# Altium footprint library ICs And Semiconductors THD.PcbLib: 507 footprints (part 20 of 32) (continued)
## LED_MENTOR_RTZ.2081G [mm] "8x Diametre 2mm Green LED Horizontal LED Array" (continued)
  text "3" at -4.227,3.375 h1
  text "4" at -4.227,0.835 h1
  text "5" at -4.227,-1.705 h1
  text "6" at -4.227,-4.245 h1
  text "7" at -4.227,-6.785 h1
  text "8" at -4.227,-9.325 h1
3D body "LED_MENTOR_RTZ.2081G.stp": height 5.08, standoff -3.3, extent -7.37,-10.16 1.93,10.16

## LED_VISHAY_TSAL6200 [mm] "5mm Infrared Emitting Diode, VISHAY TSAL"
height 13.7
pads (2):
  rect 1.3x1.3 hole 0.8: 1(-1.27,0)
  round 1.3 hole 0.8: 2(1.27,0)
Top Overlay:
  lines w0.2: -0.3,-0.6 -0.3,0.6 ; -2.5,-1.47 ccw(c0,0) -2.5,1.47 -2.5,-1.47 ; -0.3,0 0.3,0.6 0.3,-0.6 -0.3,0
Notvisible:
  lines w0.1: -1.27,1 -1.27,0 -0.27,0 ; 0,1 0,0 1,0 ; 1.27,1 1.27,0 2.27,0 ; -1.52,-0.25 -1.02,-0.25 -1.02,0.25 -1.52,0.25 -1.52,-0.25 ; 1.02,-0.25 1.52,-0.25 1.52,0.25 1.02,0.25 1.02,-0.25
  text "A" at 0.913,1 h1
  text "C" at -1.651,1 h1
Mechanical 14:
  circle w0.1: c0,0 r2.5
  lines w0.1: -0.3,-0.6 -0.3,0.6 ; -2.5,-1.47 ccw(c0,0) -2.5,1.47 -2.5,-1.47 ; -0.3,0 0.3,-0.6 0.3,0.6 -0.3,0
3D body "LED_VISHAY_TSAL6200.stp": height 13.7, standoff -3.1, extent -2.5,-2.9 2.9,2.9

## LEDLP_DIALIGHT_515-1049F [mm] "Right Angle Single Element 3.56mm Round Lightpipe"
height 5.3
pads (2):
  round 1 hole 1.95 unplated mask+0.475: 1(-6.86,0) 2(-3.89,0)
Top Overlay:
  lines w0.2: -8.13,-1.778 -8.13,-0.527 ; -8.13,0.527 -8.13,1.778 ; 1.268,-1.778 -15.413,-1.778 cw(c2.68,0) -15.413,1.778 1.268,1.778
Notvisible:
  lines w0.1: -7.36,0 -6.86,0 ; -6.86,-0.5 -6.86,0 ; -6.86,0.5 -6.86,0 ; -6.36,0 -6.86,0 ; -4.39,0 -3.89,0 ; -3.89,-0.5 -3.89,0 ; -3.89,0.5 -3.89,0 ; -3.39,0 -3.89,0 ; -0.5,0 0,0 ; 0,-0.5 0,0 ; 0,0.5 0,0 ; 0.5,0 0,0
3D body "LEDLP_DIALIGHT_515-1049F.stp": height 5.27, standoff -2.41, extent -15.5,-1.778 1.268,1.778

## LEDLP_DIALIGHT_515-1064F [mm] "Right Angle Tri-Level 2.5mm Round Light Pipe, Body 22.9 x5.22mm"
height 13.7
pads (2):
  round 1 hole 1.7 unplated mask+0.35: 1(-6.704,-2.29) 2(6.706,-2.29)
Top Overlay:
  lines w0.2: -12.167,-1.249 -12.167,2.257 -11.151,2.257 -11.151,1.241 ; -9.627,-2.544 -7.928,-2.544 ; -7.781,-2.925 -9.627,-2.925 -9.627,-1.249 ; -7.396,-1.249 -9.627,-1.249 ; -6.013,-1.249 6.014,-1.249 ; -5.628,-2.925 5.629,-2.925 ; -5.48,-2.544 5.482,-2.544 ; 7.397,-1.249 8.23,-1.249 ; 7.782,-2.925 8.23,-2.925 8.23,-1.1 ; 7.93,-2.544 8.23,-2.544 ; 8.23,1.1 8.23,1.241 -14.707,1.241 -14.707,-1.249 -9.627,-1.249
Notvisible:
  circle w0.1: c-6.704,-2.29 r0.85
  circle w0.1: c6.706,-2.29 r0.85
  lines w0.1: -7.204,-2.29 -6.704,-2.29 ; -7.204,0 -6.704,0 ; -6.704,-2.79 -6.704,-2.29 ; -6.704,-1.79 -6.704,-2.29 ; -6.704,-0.5 -6.704,0 ; -6.704,0.5 -6.704,0 ; -6.204,-2.29 -6.704,-2.29 ; -6.204,0 -6.704,0 ; -0.354,-0.354 0,0 ; -0.354,0.354 0,0 ; 0.354,-0.354 0,0 ; 0.354,0.354 0,0 ; 1.256,0 1.756,0 ; 1.756,-0.5 1.756,0 ; 1.756,0.5 1.756,0 ; 2.256,0 1.756,0 ; 6.206,-2.29 6.706,-2.29 ; 6.206,0 6.706,0 ; 6.706,-2.79 6.706,-2.29 ; 6.706,-1.79 6.706,-2.29 ; 6.706,-0.5 6.706,0 ; 6.706,0.5 6.706,0 ; 7.206,-2.29 6.706,-2.29 ; 7.206,0 6.706,0
Mechanical 14:
  lines w0.1: -12.167,-1.249 -12.167,2.257 -11.151,2.257 -11.151,1.241 ; -9.627,-2.544 8.23,-2.544 ; 3.078,-1.249 3.078,1.241 ; 8.23,-1.249 -9.627,-1.249 ; -9.627,-1.249 -9.627,-2.925 8.23,-2.925 8.23,1.241 -14.707,1.241 -14.707,-1.249 -9.627,-1.249
3D body "LEDLP_DIALIGHT_515-1064F.stp": height 13.69, standoff -2.87, extent -14.706,-2.925 8.23,2.257

## LEDLP_DIALIGHT_515-1118F [mm] "2 Array 1.9mm Round Horizontal Light Pipe, Body 55.8 x11.68mm"
height 14
pads (2):
  round 1 hole 2 unplated mask+0.5: 1(0,0) 2(0,5.791)
Top Overlay:
  lines w0.2: -38.735,-1.943 -53.975,-1.943 -53.975,-3.848 -38.735,-3.848 ; -38.735,1.943 -53.975,1.943 -53.975,3.848 -38.735,3.848 ; -1.1,6.883 -1.905,6.883 -1.905,4.801 -8.255,4.801 -38.735,3.848 ; 1.1,6.883 1.905,6.883 1.905,4.642 ; 1.905,-4.642 1.905,-4.801 -8.255,-4.801 -38.735,-3.848 ; 1.905,-1.149 1.905,1.149 ; -38.735,-3.848 -38.735,3.848
Notvisible:
  lines w0.1: -0.5,-2.896 0,-2.896 ; -0.5,0 0,0 ; -0.5,2.896 0,2.896 ; -0.5,5.791 0,5.791 ; 0,-3.396 0,-2.896 ; 0,-2.396 0,-2.896 ; 0,-0.5 0,0 ; 0,0.5 0,0 ; 0,2.396 0,2.896 ; 0,3.396 0,2.896 ; 0,5.291 0,5.791 ; 0,6.291 0,5.791 ; 0.5,-2.896 0,-2.896 ; 0.5,0 0,0 ; 0.5,2.896 0,2.896 ; 0.5,5.791 0,5.791
Mechanical 14:
  lines w0.1: -38.735,-1.943 -53.975,-1.943 -53.975,-3.848 -38.735,-3.848 ; -38.735,1.943 -53.975,1.943 -53.975,3.848 -38.735,3.848 ; -38.735,-3.848 -8.255,-4.801 1.905,-4.801 1.905,6.883 -1.905,6.883 -1.905,4.801 -8.255,4.801 -38.735,3.848 ; -38.735,-3.848 -38.735,3.848
3D body "LEDLP_DIALIGHT_515-1118F.stp": height 13.98, standoff -3.17, extent -53.975,-4.8 1.905,6.884

## LEDLP_MENTOR_1270.1010 [mm] "Right Angle Double Line 3mm Light Guide, 10x2-fold display, Body 49.12 x 23.6mm"
height 9.12
pads (20):
  round 1 hole 2.4 unplated mask+0.7: P1(-6.75,-22.86) P2(6.75,-22.86) P3(-6.75,-17.78) P4(6.75,-17.78) P5(-6.75,-12.7) P6(6.75,-12.7) P7(-6.75,-7.62) P8(6.75,-7.62) P9(-6.75,-2.54) P10(6.75,-2.54) P11(-6.75,2.54) P12(6.75,2.54) P13(-6.75,7.62) P14(6.75,7.62) P15(-6.75,12.7) P16(6.75,12.7) P17(-6.75,17.78) P18(6.75,17.78) P19(-6.75,22.86) P20(6.75,22.86)
Top Overlay:
  lines w0.2: -10.85,-24.36 -10.85,-21.36 ; -10.85,-19.28 -10.85,-16.28 ; -10.85,-14.2 -10.85,-11.2 ; -10.85,-9.12 -10.85,-6.12 ; -10.85,-4.04 -10.85,-1.04 ; -10.85,1.04 -10.85,4.04 ; -10.85,6.12 -10.85,9.12 ; -10.85,11.2 -10.85,14.2 ; -10.85,16.28 -10.85,19.28 ; -10.85,21.36 -10.85,24.36 ; -10.229,-24.36 cw(c-8.729,-22.86) -10.229,-21.36 ; -10.229,-19.28 cw(c-8.729,-17.78) -10.229,-16.28 ; -10.229,-14.2 cw(c-8.729,-12.7) -10.229,-11.2 ; -10.229,-9.12 cw(c-8.729,-7.62) -10.229,-6.12 ; -10.229,-4.04 cw(c-8.729,-2.54) -10.229,-1.04 ; -10.229,1.04 cw(c-8.729,2.54) -10.229,4.04 ; -10.229,6.12 cw(c-8.729,7.62) -10.229,9.12 ; -10.229,11.2 cw(c-8.729,12.7) -10.229,14.2 ; -10.229,16.28 cw(c-8.729,17.78) -10.229,19.28 ; -10.229,21.36 cw(c-8.729,22.86) -10.229,24.36 ; -8.85,-21.36 -8.85,-19.28 ; -8.85,-16.28 -8.85,-14.2 ; -8.85,-11.2 -8.85,-9.12 ; -8.85,-6.12 -8.85,-4.04 ; -8.85,-1.04 -8.85,1.04 ; -8.85,4.04 -8.85,6.12 ; -8.85,9.12 -8.85,11.2 ; -8.85,14.2 -8.85,16.28 ; -8.85,19.28 -8.85,21.36 ; -7.55,-24.36 -14.65,-24.36 -14.65,-24.06 -14.85,-23.86 -14.85,-21.86 -14.65,-21.66 -14.65,-21.36 -7.55,-21.36 ; -7.55,-19.28 -14.65,-19.28 -14.65,-18.98 -14.85,-18.78 -14.85,-16.78 -14.65,-16.58 -14.65,-16.28 -7.55,-16.28 ; -7.55,-14.2 -14.65,-14.2 -14.65,-13.9 -14.85,-13.7 -14.85,-11.7 -14.65,-11.5 -14.65,-11.2 -7.55,-11.2 ; -7.55,-9.12 -14.65,-9.12 -14.65,-8.82 -14.85,-8.62 -14.85,-6.62 -14.65,-6.42 -14.65,-6.12 -7.55,-6.12 ; -7.55,-4.04 -14.65,-4.04 -14.65,-3.74 -14.85,-3.54 -14.85,-1.54 -14.65,-1.34 -14.65,-1.04 -7.55,-1.04 ; -7.55,1.04 -14.65,1.04 -14.65,1.34 -14.85,1.54 -14.85,3.54 -14.65,3.74 -14.65,4.04 -7.55,4.04 ; -7.55,6.12 -14.65,6.12 -14.65,6.42 -14.85,6.62 -14.85,8.62 -14.65,8.82 -14.65,9.12 -7.55,9.12 ; -7.55,11.2 -14.65,11.2 -14.65,11.5 -14.85,11.7 -14.85,13.7 -14.65,13.9 -14.65,14.2 -7.55,14.2 ; -7.55,16.28 -14.65,16.28 -14.65,16.58 -14.85,16.78 -14.85,18.78 -14.65,18.98 -14.65,19.28 -7.55,19.28 ; -7.55,21.36 -14.65,21.36 -14.65,21.66 -14.85,21.86 -14.85,23.86 -14.65,24.06 -14.65,24.36 -7.55,24.36 ; 7.55,-24.36 8.75,-24.36 8.75,-21.36 7.55,-21.36 ; 7.55,-19.28 8.75,-19.28 8.75,-16.28 7.55,-16.28 ; 7.55,-14.2 8.75,-14.2 8.75,-11.2 7.55,-11.2 ; 7.55,-9.12 8.75,-9.12 8.75,-6.12 7.55,-6.12 ; 7.55,-4.04 8.75,-4.04 8.75,-1.04 7.55,-1.04 ; 7.55,1.04 8.75,1.04 8.75,4.04 7.55,4.04 ; 7.55,6.12 8.75,6.12 8.75,9.12 7.55,9.12 ; 7.55,11.2 8.75,11.2 8.75,14.2 7.55,14.2 ; 7.55,16.28 8.75,16.28 8.75,19.28 7.55,19.28 ; 7.55,21.36 8.75,21.36 8.75,24.36 7.55,24.36
Notvisible:
  drawing of 344 lines, arcs and shapes, not listed
Mechanical 14:
  lines w0.1: -10.85,-24.36 -10.85,-21.36 ; -10.85,-19.28 -10.85,-16.28 ; -10.85,-14.2 -10.85,-11.2 ; -10.85,-9.12 -10.85,-6.12 ; -10.85,-4.04 -10.85,-1.04 ; -10.85,1.04 -10.85,4.04 ; -10.85,6.12 -10.85,9.12 ; -10.85,11.2 -10.85,14.2 ; -10.85,16.28 -10.85,19.28 ; -10.85,21.36 -10.85,24.36 ; -10.229,-24.36 cw(c-8.729,-22.86) -10.229,-21.36 ; -10.229,-19.28 cw(c-8.729,-17.78) -10.229,-16.28 ; -10.229,-14.2 cw(c-8.729,-12.7) -10.229,-11.2 ; -10.229,-9.12 cw(c-8.729,-7.62) -10.229,-6.12 ; -10.229,-4.04 cw(c-8.729,-2.54) -10.229,-1.04 ; -10.229,1.04 cw(c-8.729,2.54) -10.229,4.04 ; -10.229,6.12 cw(c-8.729,7.62) -10.229,9.12 ; -10.229,11.2 cw(c-8.729,12.7) -10.229,14.2 ; -10.229,16.28 cw(c-8.729,17.78) -10.229,19.28 ; -10.229,21.36 cw(c-8.729,22.86) -10.229,24.36 ; -8.85,-21.36 -8.85,-19.28 ; -8.85,-16.28 -8.85,-14.2 ; -8.85,-11.2 -8.85,-9.12 ; -8.85,-6.12 -8.85,-4.04 ; -8.85,-1.04 -8.85,1.04 ; -8.85,4.04 -8.85,6.12 ; -8.85,9.12 -8.85,11.2 ; -8.85,14.2 -8.85,16.28 ; -8.85,19.28 -8.85,21.36 ; 0.65,-24.36 0.65,-21.36 ; 0.65,-19.28 0.65,-16.28 ; 0.65,-14.2 0.65,-11.2 ; 0.65,-9.12 0.65,-6.12 ; 0.65,-4.04 0.65,-1.04 ; 0.65,1.04 0.65,4.04 ; 0.65,6.12 0.65,9.12 ; 0.65,11.2 0.65,14.2 ; 0.65,16.28 0.65,19.28 ; 0.65,21.36 0.65,24.36 ; 0.95,-21.36 0.95,-19.28 ; 0.95,-16.28 0.95,-14.2 ; 0.95,-11.2 0.95,-9.12 ; 0.95,-6.12 0.95,-4.04 ; 0.95,-1.04 0.95,1.04 ; 0.95,4.04 0.95,6.12 ; 0.95,9.12 0.95,11.2 ; 0.95,14.2 0.95,16.28 ; 0.95,19.28 0.95,21.36 ; -14.85,-23.86 -14.85,-21.86 -14.65,-21.66 -14.65,-21.36 8.75,-21.36 8.75,-24.36 -14.65,-24.36 -14.65,-24.06 -14.85,-23.86 ; -14.85,-18.78 -14.85,-16.78 -14.65,-16.58 -14.65,-16.28 8.75,-16.28 8.75,-19.28 -14.65,-19.28 -14.65,-18.98 -14.85,-18.78 ; -14.85,-13.7 -14.85,-11.7 -14.65,-11.5 -14.65,-11.2 8.75,-11.2 8.75,-14.2 -14.65,-14.2 -14.65,-13.9 -14.85,-13.7 ; -14.85,-8.62 -14.85,-6.62 -14.65,-6.42 -14.65,-6.12 8.75,-6.12 8.75,-9.12 -14.65,-9.12 -14.65,-8.82 -14.85,-8.62 ; -14.85,-3.54 -14.85,-1.54 -14.65,-1.34 -14.65,-1.04 8.75,-1.04 8.75,-4.04 -14.65,-4.04 -14.65,-3.74 -14.85,-3.54 ; -14.85,1.54 -14.85,3.54 -14.65,3.74 -14.65,4.04 8.75,4.04 8.75,1.04 -14.65,1.04 -14.65,1.34 -14.85,1.54 ; -14.85,6.62 -14.85,8.62 -14.65,8.82 -14.65,9.12 8.75,9.12 8.75,6.12 -14.65,6.12 -14.65,6.42 -14.85,6.62 ; -14.85,11.7 -14.85,13.7 -14.65,13.9 -14.65,14.2 8.75,14.2 8.75,11.2 -14.65,11.2 -14.65,11.5 -14.85,11.7 ; -14.85,16.78 -14.85,18.78 -14.65,18.98 -14.65,19.28 8.75,19.28 8.75,16.28 -14.65,16.28 -14.65,16.58 -14.85,16.78 ; -14.85,21.86 -14.85,23.86 -14.65,24.06 -14.65,24.36 8.75,24.36 8.75,21.36 -14.65,21.36 -14.65,21.66 -14.85,21.86
3D body "LEDLP_MENTOR_1270.1010_Part1.stp": height 9.12, standoff 0.6, extent -8.85,-24.36 0.95,24.36
3D body "LEDLP_MENTOR_1270.1010_Part2.stp": height 9.12, standoff -3.1, extent -14.85,-24.36 8.75,24.36

## LEDLP_MENTOR_1276.1003 [mm] "Right Angle Tri-Level 3mm Round Light Pipe, Body 25.2 x 11.3mm"
height 18.2
pads (2):
  round 1 hole 2.4 unplated mask+0.7: 1(0,4.15) 2(0,-4.15)
Top Overlay:
  lines w0.2: -12.6,-1.5 -12.6,1.5 ; -12.6,-0.794 -11.7,-1.5 ; -12.6,0.794 -11.7,1.5 ; -8.3,-1.6 -3.5,-1.6 ; -8.3,1.6 -3.5,1.6 ; -3.5,-2.3 -8.3,-2.3 -8.3,2.3 -3.5,2.3 ; -3.5,-1.5 -15.6,-1.5 ; -3.5,1.5 -15.6,1.5 ; -3.3,-2.55 -3.3,-5.65 3.3,-5.65 3.3,-2.3 ; -3.3,2.55 -3.3,5.65 3.3,5.65 3.3,2.3 ; 3.3,-1.5 3.3,-2.3 ; 3.3,1.5 3.3,2.3 ; 3.3,1.6 4.1,1.6 ; 3.317,-1.6 4.1,-1.6 ; 4.1,-2.3 3.3,-2.3 ; 4.1,2.3 3.3,2.3 ; 7.1,-2.3 8.1,-2.3 8.1,2.3 7.1,2.3 ; 7.1,-1.6 7.4,-1.6 7.4,1.6 7.1,1.6 ; -15.6,-1.5 cw(c-15.6,0) -15.6,1.5 ; -15.6,-1.5 -15.6,1.5
Notvisible:
  circle w0.1: c0,-4.15 r1.2
  circle w0.1: c0,4.15 r1.2
  lines w0.1: -2.5,-1.425 -2,-1.425 ; -2.5,0 -2,0 ; -2.5,1.425 -2,1.425 ; -2,-1.925 -2,-1.425 ; -2,-0.925 -2,-1.425 ; -2,-0.5 -2,0 ; -2,0.5 -2,0 ; -2,0.925 -2,1.425 ; -2,1.925 -2,1.425 ; -1.5,-1.425 -2,-1.425 ; -1.5,0 -2,0 ; -1.5,1.425 -2,1.425 ; -0.5,-4.15 0,-4.15 ; -0.5,0 0,0 ; -0.5,4.15 0,4.15 ; 0,-4.65 0,-4.15 ; 0,-3.65 0,-4.15 ; 0,-0.5 0,0 ; 0,0.5 0,0 ; 0,3.65 0,4.15 ; 0,4.65 0,4.15 ; 0.5,-4.15 0,-4.15 ; 0.5,0 0,0 ; 0.5,4.15 0,4.15 ; 1.3,-1.425 1.8,-1.425 ; 1.3,0 1.8,0 ; 1.3,1.425 1.8,1.425 ; 1.8,-1.925 1.8,-1.425 ; 1.8,-0.925 1.8,-1.425 ; 1.8,-0.5 1.8,0 ; 1.8,0.5 1.8,0 ; 1.8,0.925 1.8,1.425 ; 1.8,1.925 1.8,1.425 ; 2.3,-1.425 1.8,-1.425 ; 2.3,0 1.8,0 ; 2.3,1.425 1.8,1.425 ; 5.1,-1.425 5.6,-1.425 ; 5.1,0 5.6,0 ; 5.1,1.425 5.6,1.425 ; 5.6,-1.925 5.6,-1.425 ; 5.6,-0.925 5.6,-1.425 ; 5.6,-0.5 5.6,0 ; 5.6,0.5 5.6,0 ; 5.6,0.925 5.6,1.425 ; 5.6,1.925 5.6,1.425 ; 6.1,-1.425 5.6,-1.425 ; 6.1,0 5.6,0 ; 6.1,1.425 5.6,1.425 ; -3.2,-2.25 -0.8,-2.25 -0.8,-0.6 -3.2,-0.6 -3.2,-2.25 ; -3.2,0.6 -0.8,0.6 -0.8,2.25 -3.2,2.25 -3.2,0.6 ; 0.6,-2.25 3,-2.25 3,-0.6 0.6,-0.6 0.6,-2.25 ; 0.6,0.6 3,0.6 3,2.25 0.6,2.25 0.6,0.6 ; 4.4,-2.25 6.8,-2.25 6.8,-0.6 4.4,-0.6 4.4,-2.25 ; 4.4,0.6 6.8,0.6 6.8,2.25 4.4,2.25 4.4,0.6
Mechanical 14:
  lines w0.1: -12.6,-1.5 -12.6,1.5 ; -12.6,-0.794 -11.7,-1.5 ; -12.6,0.794 -11.7,1.5 ; -8.3,-1.6 -3.3,-1.6 ; -8.3,1.6 -3.3,1.6 ; -3.3,-1.5 -3.3,-2.3 ; -3.3,1.5 -3.3,5.65 3.3,5.65 3.3,2.3 ; -3.3,2.3 -8.3,2.3 -8.3,-2.3 -3.3,-2.3 ; -1.8,-5.65 -1.8,-1.5 ; -1.8,1.5 -1.8,5.65 ; 0.8,-5.65 0.8,-1.5 ; 0.8,1.5 0.8,5.65 ; 2.3,-5.65 2.3,-1.5 ; 2.3,1.5 2.3,5.65 ; 3.3,-1.5 3.3,-2.3 ; 3.3,1.5 3.3,2.3 ; 3.3,1.6 7.4,1.6 7.4,-1.6 3.317,-1.6 ; -15.6,-1.5 cw(c-15.6,0) -15.6,1.5 ; -15.6,-1.5 -15.6,1.5 ; -15.6,-1.5 7.193,-1.5 7.193,1.5 -15.6,1.5 ; -3.3,-2.3 -3.3,-5.65 3.3,-5.65 3.3,-2.3 ; 3.3,-2.3 8.1,-2.3 8.1,2.3 3.3,2.3
3D body "LEDLP_MENTOR_1276.1003.stp": height 18.2, standoff -2.9, extent -17.1,-5.65 8.1,5.65

## LEM_CAS 25-NP [mm] "LEM Current Transducer, Body 21.91x13.4mm"
height 16.5
pads (9):
  rrect100% 1.9x2.54 hole 1.3: 1(-2.54,6.35) 2(0,6.35) 3(2.54,6.35) 8(2.54,-6.35) 9(0,-6.35) 10(-2.54,-6.35)
  rrect100% 2.3x1.3 hole 0.8: 11(-10.16,-2.54) 12(-10.16,0) 13(-10.16,2.54)
Top Overlay:
  lines w0.2: -11.71,-3.6 -3.84,-3.6 ; -11.71,3.54 -11.71,4.9 cw(c-9.91,4.9) -9.91,6.7 -3.84,6.7 ; -11.26,-3.8 -11.26,-3.6 ; -5.55,-6.7 -5.55,-5.029 -3.84,-5.029 ; -5.55,6.7 -5.55,5.029 -3.84,5.029 ; -3.84,-6.7 -9.91,-6.7 cw(c-9.91,-4.9) -11.71,-4.9 -11.71,-3.9 cw(c-11.61,-3.9) -11.61,-3.8 -3.84,-3.8 ; -2.54,-3 -2.54,-0.75 cw(c-2.54,0) -2.54,0.75 -2.54,3 ; 0,-3 0,-0.75 cw(c0,0) 0,0.75 0,3 ; 2.54,-3 2.54,-0.75 cw(c2.54,0) 2.54,0.75 2.54,3 ; 3.84,-6.7 4.68,-6.7 4.68,-6.625 5.48,-6.625 5.48,-6.7 7.22,-6.7 7.22,-6.625 8.02,-6.625 8.02,-6.7 10.1,-6.7 ccw(c10.1,-6.6) 10.2,-6.6 10.2,-3.9 ccw(c10.1,-3.9) 10.1,-3.8 7.5,-3.8 ; 3.84,-5.029 10.2,-5.029 ; 3.84,5.029 10.2,5.029 ; 3.84,6.7 4.68,6.7 4.68,6.632 5.48,6.632 5.48,6.7 7.22,6.7 7.22,6.632 8.02,6.632 8.02,6.7 10.1,6.7 cw(c10.1,6.6) 10.2,6.6 10.2,-3.5 cw(c10.1,-3.5) 10.1,-3.6 7.5,-3.6 ; 9.75,-3.8 9.75,-3.6 ; -2.915,2.25 -2.165,2.25 -2.54,1.5 -2.915,2.25 ; -0.375,2.25 0.375,2.25 0,1.5 -0.375,2.25 ; 2.165,2.25 2.915,2.25 2.54,1.5 2.165,2.25
  text "3" at 2.2,3.5 h1
  text "2" at -0.4,3.5 h1
  text "1" at -2.8,3.5 h1
  text "8" at 2.2,-4.5 h1
  text "9" at -0.4,-4.5 h1
  text "10" at -3.2,-4.5 h1
  text "+" at -8.26,2.04 h1.25
  text "0V" at -8.26,-0.5 h1
  text "OUT" at -8.26,-3.04 h1
  text "IN" at 4.5,3.5 h1
  text "OUT" at 4.5,-4.5 h1
Notvisible:
  lines w0.1: -10.66,-2.54 -10.16,-2.54 ; -10.66,0 -10.16,0 ; -10.66,2.54 -10.16,2.54 ; -10.16,-3.04 -10.16,-2.54 ; -10.16,-2.04 -10.16,-2.54 ; -10.16,-0.5 -10.16,0 ; -10.16,0.5 -10.16,0 ; -10.16,2.04 -10.16,2.54 ; -10.16,3.04 -10.16,2.54 ; -9.66,-2.54 -10.16,-2.54 ; -9.66,0 -10.16,0 ; -9.66,2.54 -10.16,2.54 ; -3.04,-6.35 -2.54,-6.35 ; -3.04,6.35 -2.54,6.35 ; -2.54,-6.85 -2.54,-6.35 ; -2.54,-5.85 -2.54,-6.35 ; -2.54,5.85 -2.54,6.35 ; -2.54,6.85 -2.54,6.35 ; -2.04,-6.35 -2.54,-6.35 ; -2.04,6.35 -2.54,6.35 ; -0.5,-6.35 0,-6.35 ; -0.5,0 0,0 ; -0.5,6.35 0,6.35 ; 0,-6.85 0,-6.35 ; 0,-5.85 0,-6.35 ; 0,-0.5 0,0 ; 0,0.5 0,0 ; 0,5.85 0,6.35 ; 0,6.85 0,6.35 ; 0.5,-6.35 0,-6.35 ; 0.5,0 0,0 ; 0.5,6.35 0,6.35 ; 2.04,-6.35 2.54,-6.35 ; 2.04,6.35 2.54,6.35 ; 2.54,-6.85 2.54,-6.35 ; 2.54,-5.85 2.54,-6.35 ; 2.54,5.85 2.54,6.35 ; 2.54,6.85 2.54,6.35 ; 3.04,-6.35 2.54,-6.35 ; 3.04,6.35 2.54,6.35
  text "4" at 5.58,5.95 h1
  text "5" at 8.12,5.979 h1
  text "7" at 5.58,-6.7 h1
  text "6" at 8.12,-6.695 h1
Mechanical 14:
  lines w0.1: -11.26,-3.8 -11.26,-3.6 ; -5.55,-6.7 -5.55,-5.029 10.2,-5.029 ; -5.55,6.7 -5.55,5.029 10.2,5.029 ; -3.84,-3.8 -11.61,-3.8 ccw(c-11.61,-3.9) -11.71,-3.9 -11.71,-4.9 ccw(c-9.91,-4.9) -9.91,-6.7 -2.94,-6.7 -2.94,-6.625 -2.14,-6.625 -2.14,-6.7 -0.4,-6.7 -0.4,-6.625 0.4,-6.625 0.4,-6.7 2.14,-6.7 2.14,-6.625 2.94,-6.625 2.94,-6.7 4.68,-6.7 4.68,-6.625 5.48,-6.625 5.48,-6.7 7.22,-6.7 7.22,-6.625 8.02,-6.625 8.02,-6.7 10.1,-6.7 ccw(c10.1,-6.6) 10.2,-6.6 10.2,-3.9 ccw(c10.1,-3.9) 10.1,-3.8 7.5,-3.8 ; -3.84,-3.6 -11.71,-3.6 -11.71,4.9 cw(c-9.91,4.9) -9.91,6.7 -2.94,6.7 -2.94,6.632 -2.14,6.632 -2.14,6.7 -0.4,6.7 -0.4,6.632 0.4,6.632 0.4,6.7 2.14,6.7 2.14,6.632 2.94,6.632 2.94,6.7 4.68,6.7 4.68,6.632 5.48,6.632 5.48,6.7 7.22,6.7 7.22,6.632 8.02,6.632 8.02,6.7 10.1,6.7 cw(c10.1,6.6) 10.2,6.6 10.2,-3.5 cw(c10.1,-3.5) 10.1,-3.6 7.5,-3.6 ; -2.94,-6.65 ccw(c-2.54,-6.35) -2.14,-6.65 ; -2.94,6.65 cw(c-2.54,6.35) -2.14,6.65 ; -2.54,-3 -2.54,-0.75 cw(c-2.54,0) -2.54,0.75 -2.54,3 ; -0.4,-6.65 ccw(c0,-6.35) 0.4,-6.65 ; -0.4,6.65 cw(c0,6.35) 0.4,6.65 ; 0,-3 0,-0.75 cw(c0,0) 0,0.75 0,3 ; 2.14,-6.65 ccw(c2.54,-6.35) 2.94,-6.65 ; 2.14,6.65 cw(c2.54,6.35) 2.94,6.65 ; 2.54,-3 2.54,-0.75 cw(c2.54,0) 2.54,0.75 2.54,3 ; 9.75,-3.8 9.75,-3.6 ; -2.915,2.25 -2.165,2.25 -2.54,1.5 -2.915,2.25 ; -0.375,2.25 0.375,2.25 0,1.5 -0.375,2.25 ; 2.165,2.25 2.915,2.25 2.54,1.5 2.165,2.25
  text "3" at 2.2,3.5 h1
  text "2" at -0.4,3.5 h1
  text "1" at -2.8,3.5 h1
  text "8" at 2.2,-4.5 h1
  text "9" at -0.4,-4.5 h1
  text "10" at -3.2,-4.5 h1
  text "+" at -8.26,2.04 h1.25
  text "0V" at -8.26,-0.5 h1
  text "OUT" at -8.26,-3.04 h1
  text "IN" at 4.5,3.5 h1
  text "OUT" at 4.5,-4.5 h1
3D body "LEM_CAS 25-NP.stp": height 16.5, standoff -3.5, extent -11.71,-6.849 10.2,6.85

## LEM_CTSR [mm] "LEM Current Transducer, Body 45x17.9mm, CTSR Series"
height 44.6
pads (6):
  oval 1.524x2.032 hole 1.2: 1(8.868,-6) 2(11.408,-6) 3(13.948,-6) 4(16.488,-6)
  oval 2.8x3.4 hole 2: 5(-16.902,3.15) 6(16.898,3.15)
Top Overlay:
  lines w0.2: -19.07,-8.95 cw(c-19.057,-7.317) -20.687,-7.23 -20.687,-1.5 cw(c-18.887,-1.5) -18.887,0.3 -14.188,0.3 ; 14.188,0.3 18.887,0.3 cw(c18.887,-1.5) 20.687,-1.5 20.687,-7.23 cw(c19.057,-7.317) 19.07,-8.95 ; -22.505,-7 -21.395,-6.989 -21.4,-7.239 -22.5,-7.25 -22.495,-7.406 ccw(c-20.896,-7.35) -20.896,-8.95 20.896,-8.95 ccw(c20.896,-7.35) 22.495,-7.406 22.5,-7.25 21.4,-7.25 21.396,-7 22.505,-7 22.24,8.15 ccw(c21.23,7.913) 21.244,8.95 -21.244,8.95 ccw(c-21.244,7.95) -22.223,8.15 -22.505,-7 ; -2.004,0.75 -0.005,5.699 2.004,0.75 0.909,0.75 0.909,-5.45 -0.909,-5.45 -0.909,0.75 -2.004,0.75
  text "Out" at 17.113,-4.385 h1.2
  text "Ref" at 14.573,-4.385 h1.2
  text "0V" at 12.033,-4.385 h1.2
  text "+" at 9.368,-4.36 h1.2
Notvisible:
  circle w0.1: c8.868,-6 r0.6
  circle w0.1: c11.408,-6 r0.6
  circle w0.1: c13.948,-6 r0.6
  circle w0.1: c16.488,-6 r0.6
  circle w0.1: c16.898,3.15 r1
  circle w0.1: c-16.902,3.15 r1
  lines w0.1: -17.402,2.85 -16.902,2.85 ; -17.402,3.45 -16.902,3.45 ; -17.256,2.796 -16.902,3.15 ; -17.256,3.504 -16.902,3.15 ; -16.902,2.35 -16.902,2.85 ; -16.902,3.95 -16.902,3.45 ; -16.549,2.796 -16.902,3.15 ; -16.549,3.504 -16.902,3.15 ; -16.402,2.85 -16.902,2.85 ; -16.402,3.45 -16.902,3.45 ; -0.5,0 0,0 ; 0,-0.5 0,0 ; 0,0.5 0,0 ; 0.5,0 0,0 ; 8.368,-6.262 8.868,-6.262 ; 8.368,-5.746 8.868,-5.746 ; 8.514,-6.354 8.868,-6 ; 8.514,-5.646 8.868,-6 ; 8.868,-6.762 8.868,-6.262 ; 8.868,-5.246 8.868,-5.746 ; 9.221,-6.354 8.868,-6 ; 9.221,-5.646 8.868,-6 ; 9.368,-6.262 8.868,-6.262 ; 9.368,-5.746 8.868,-5.746 ; 10.908,-6.262 11.408,-6.262 ; 10.908,-5.746 11.408,-5.746 ; 11.054,-6.354 11.408,-6 ; 11.054,-5.646 11.408,-6 ; 11.408,-6.762 11.408,-6.262 ; 11.408,-5.246 11.408,-5.746 ; 11.761,-6.354 11.408,-6 ; 11.761,-5.646 11.408,-6 ; 11.908,-6.262 11.408,-6.262 ; 11.908,-5.746 11.408,-5.746 ; 13.448,-6.262 13.948,-6.262 ; 13.448,-5.746 13.948,-5.746 ; 13.594,-6.354 13.948,-6 ; 13.594,-5.646 13.948,-6 ; 13.948,-6.762 13.948,-6.262 ; 13.948,-5.246 13.948,-5.746 ; 14.301,-6.354 13.948,-6 ; 14.301,-5.646 13.948,-6 ; 14.448,-6.262 13.948,-6.262 ; 14.448,-5.746 13.948,-5.746 ; 15.988,-6.262 16.488,-6.262 ; 15.988,-5.746 16.488,-5.746 ; 16.134,-6.354 16.488,-6 ; 16.134,-5.646 16.488,-6 ; 16.398,2.85 16.898,2.85 ; 16.398,3.45 16.898,3.45 ; 16.488,-6.762 16.488,-6.262 ; 16.488,-5.246 16.488,-5.746 ; 16.544,2.796 16.898,3.15 ; 16.544,3.504 16.898,3.15 ; 16.841,-6.354 16.488,-6 ; 16.841,-5.646 16.488,-6 ; 16.898,2.35 16.898,2.85 ; 16.898,3.95 16.898,3.45 ; 16.988,-6.262 16.488,-6.262 ; 16.988,-5.746 16.488,-5.746 ; 17.251,2.796 16.898,3.15 ; 17.251,3.504 16.898,3.15 ; 17.398,2.85 16.898,2.85 ; 17.398,3.45 16.898,3.45 ; -18.302,2.85 ccw(c-16.902,2.85) -15.502,2.85 -15.502,3.45 ccw(c-16.902,3.45) -18.302,3.45 -18.302,2.85 ; 8.106,-6.262 ccw(c8.868,-6.262) 9.63,-6.262 9.63,-5.746 ccw(c8.868,-5.746) 8.106,-5.746 8.106,-6.262 ; 10.646,-6.262 ccw(c11.408,-6.262) 12.17,-6.262 12.17,-5.746 ccw(c11.408,-5.746) 10.646,-5.746 10.646,-6.262 ; 13.186,-6.262 ccw(c13.948,-6.262) 14.71,-6.262 14.71,-5.746 ccw(c13.948,-5.746) 13.186,-5.746 13.186,-6.262 ; 15.498,2.85 ccw(c16.898,2.85) 18.298,2.85 18.298,3.45 ccw(c16.898,3.45) 15.498,3.45 15.498,2.85 ; 15.726,-6.262 ccw(c16.488,-6.262) 17.25,-6.262 17.25,-5.746 ccw(c16.488,-5.746) 15.726,-5.746 15.726,-6.262
Mechanical 14:
  lines w0.1: -19.07,-8.95 cw(c-19.057,-7.317) -20.687,-7.23 -20.687,-1.5 cw(c-18.887,-1.5) -18.887,0.3 -14.188,0.3 ; 14.188,0.3 18.887,0.3 cw(c18.887,-1.5) 20.687,-1.5 20.687,-7.23 cw(c19.057,-7.317) 19.07,-8.95 ; -22.505,-7 -21.395,-6.989 -21.4,-7.239 -22.5,-7.25 -22.495,-7.406 ccw(c-20.896,-7.35) -20.896,-8.95 20.896,-8.95 ccw(c20.896,-7.35) 22.495,-7.406 22.5,-7.25 21.4,-7.25 21.396,-7 22.505,-7 22.24,8.15 ccw(c21.23,7.913) 21.244,8.95 -21.244,8.95 ccw(c-21.244,7.95) -22.223,8.15 -22.505,-7 ; -2.004,0.75 -0.005,5.699 2.004,0.75 0.909,0.75 0.909,-5.45 -0.909,-5.45 -0.909,0.75 -2.004,0.75
  text "Out" at 17.113,-4.385 h1.2
  text "Ref" at 14.573,-4.385 h1.2
  text "0V" at 12.033,-4.385 h1.2
  text "+" at 9.368,-4.36 h1.2
3D body "LEM_CTSR.stp": height 44.56, standoff -3.5, extent -22.505,-8.95 22.505,8.95